# Altium footprint library Connectors.PcbLib: 117 footprints (part 3 of 8)
Each footprint in its own frame and in the unit in brackets; x right, y up, seen from the top. Pads: shape width x height; smd on the part's side, far side on the other; paste and mask are expansions set on the pad; w line width, h text height; cw(c..) or ccw(c..) is an arc to the next point about the centre after c.
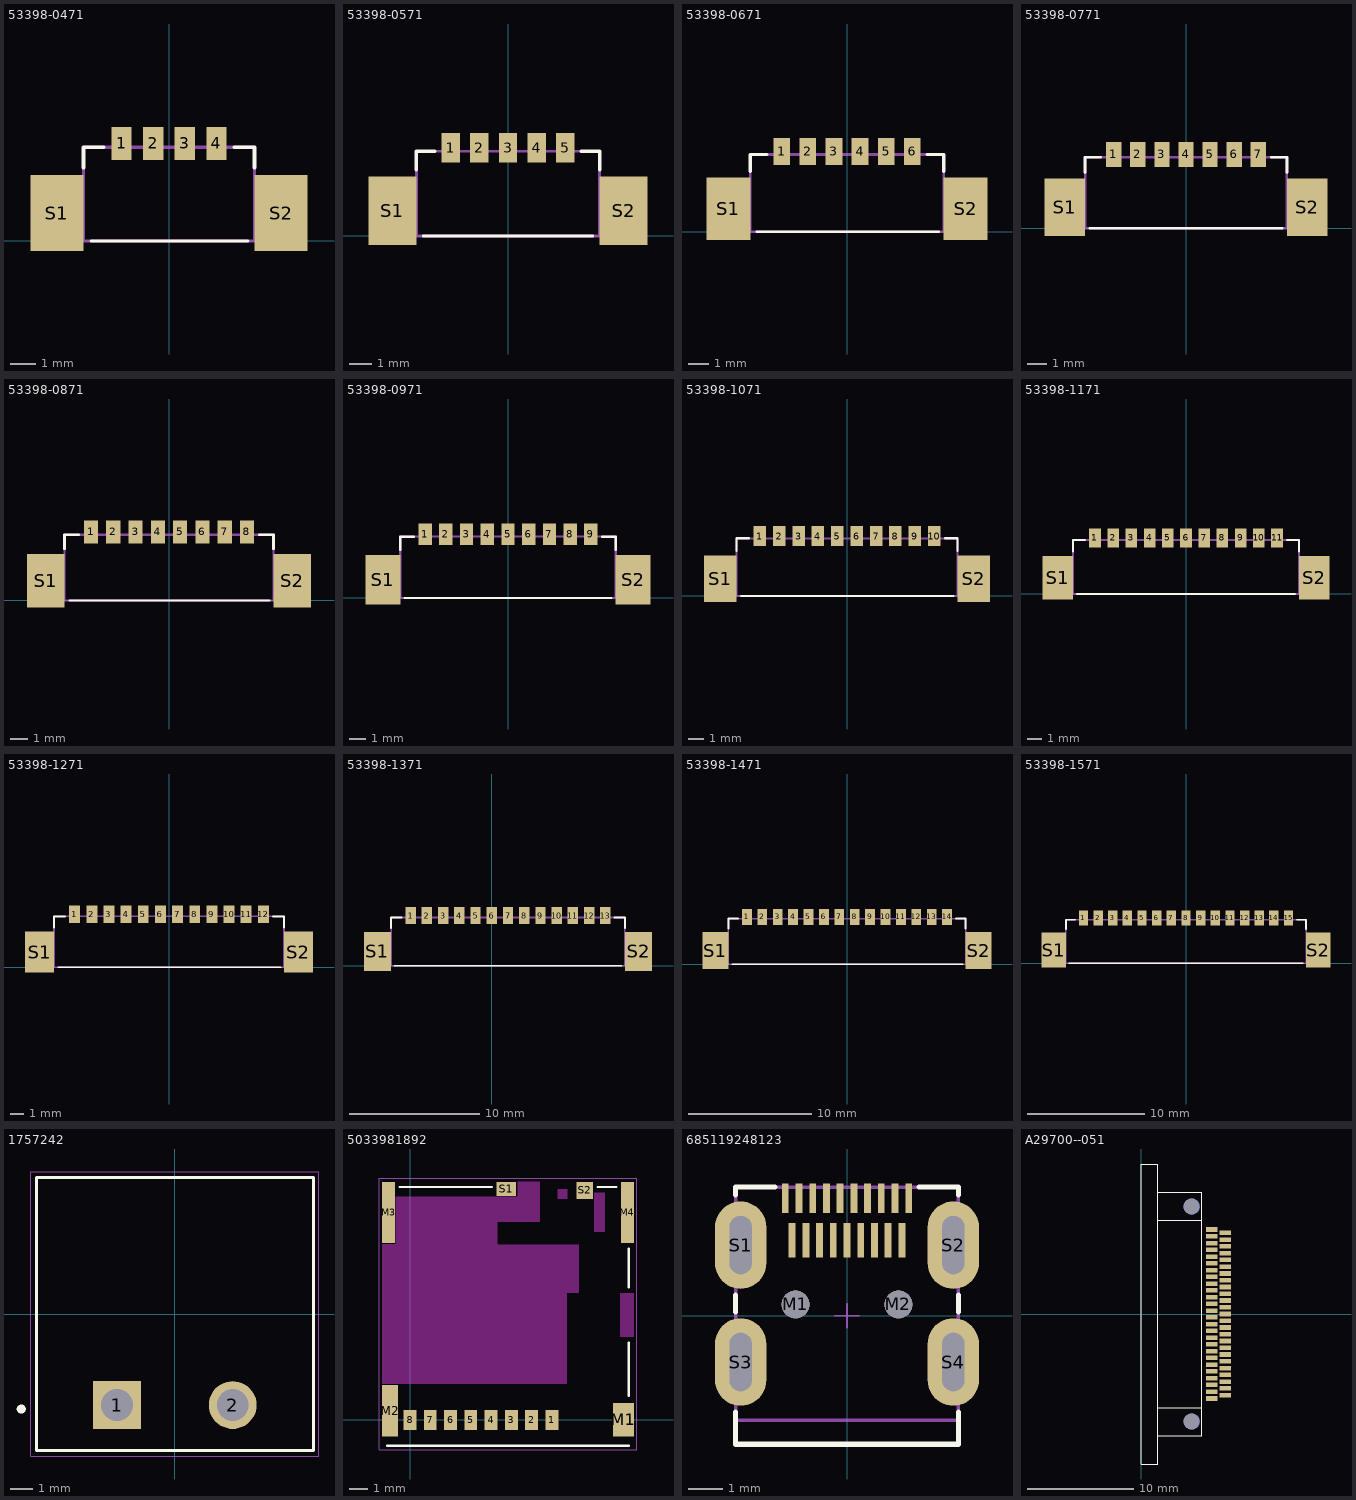
[diagram p2: the footprints below, top view; thin cyan lines are the x and y axes]

## 53398-0471 [mm] "Molex 1.25mm SMD"
pads (6):
  rect 0.8x1.3 smd: 1(-1.875,3.85) 2(-0.625,3.85) 3(0.625,3.85) 4(1.875,3.85)
  rect 2.1x3 smd: S1(-4.425,1.1) S2(4.425,1.1)
Top Overlay:
  lines w0.127: -3.075,0 3.125,0
  lines w0.152: -3.375,2.9 -3.375,3.7 -2.575,3.7 ; 2.575,3.7 3.375,3.7 3.375,2.9
Mechanical 13:
  lines w0.127: -4.375,0 4.375,0 ; -3.375,0 -3.375,3.7 3.375,3.7 3.375,0
3D body "533980471.stp": height 4.71, standoff 0.01, extent -5.075,0.025 5.075,4.225

## 53398-0571 [mm] "Molex 1.25mm SMD"
pads (7):
  rect 0.8x1.3 smd: 1(-2.5,3.85) 2(-1.25,3.85) 3(0,3.85) 4(1.25,3.85) 5(2.5,3.85)
  rect 2.1x3 smd: S1(-5.05,1.1) S2(5.05,1.1)
Top Overlay:
  lines w0.127: -3.7,0 3.7,0
  lines w0.152: -4,2.9 -4,3.7 -3.2,3.7 ; 3.2,3.7 4,3.7 4,2.9
Mechanical 13:
  lines w0.127: -5.5,0 5.5,0 ; -4,0 -4,3.7 4,3.7 4,0
3D body "533980571.stp": height 4.72, standoff 0.02, extent -5.7,0 5.7,4.2

## 53398-0671 [mm] "Molex 1.25mm SMD"
pads (8):
  rect 0.8x1.3 smd: 1(-3.125,3.85) 2(-1.875,3.85) 3(-0.625,3.85) 4(0.625,3.85) 5(1.875,3.85) 6(3.125,3.85)
  rect 2.1x3 smd: S1(-5.675,1.1) S2(5.675,1.1)
Top Overlay:
  lines w0.127: -4.325,0 4.375,0
  lines w0.152: -4.625,2.9 -4.625,3.7 -3.825,3.7 ; 3.825,3.7 4.625,3.7 4.625,2.9
Mechanical 13:
  lines w0.127: -5.625,0 5.625,0 ; -4.625,0 -4.625,3.7 4.625,3.7 4.625,0
3D body "533980671.stp": height 4.71, standoff 0.01, extent -6.325,0.025 6.325,4.225

## 53398-0771 [mm] "Molex 1.25mm SMD"
pads (9):
  rect 0.8x1.3 smd: 1(-3.75,3.85) 2(-2.5,3.85) 3(-1.25,3.85) 4(0,3.85) 5(1.25,3.85) 6(2.5,3.85) 7(3.75,3.85)
  rect 2.1x3 smd: S1(-6.3,1.1) S2(6.3,1.1)
Top Overlay:
  lines w0.127: -5,0 5,0
  lines w0.152: -5.25,2.9 -5.25,3.7 -4.45,3.7 ; 4.45,3.7 5.25,3.7 5.25,2.9
Mechanical 13:
  lines w0.127: -6.25,0 6.25,0 ; -5.25,0 -5.25,3.7 5.25,3.7 5.25,0
3D body "533980771.stp": height 4.71, standoff 0.01, extent -6.95,0.025 6.95,4.225

## 53398-0871 [mm] "Molex 1.25mm SMD"
pads (10):
  rect 0.8x1.3 smd: 1(-4.375,3.85) 2(-3.125,3.85) 3(-1.875,3.85) 4(-0.625,3.85) 5(0.625,3.85) 6(1.875,3.85) 7(3.125,3.85) 8(4.375,3.85)
  rect 2.1x3 smd: S1(-6.925,1.1) S2(6.925,1.1)
Top Overlay:
  lines w0.127: -5.575,0 5.625,0
  lines w0.152: -5.875,2.9 -5.875,3.7 -5.075,3.7 ; 5.075,3.7 5.875,3.7 5.875,2.9
Mechanical 13:
  lines w0.127: -6.875,0 6.875,0 ; -5.875,0 -5.875,3.7 5.875,3.7 5.875,0
3D body "533980871.stp": height 4.71, standoff 0.01, extent -7.575,0.025 7.575,4.225

## 53398-0971 [mm] "Molex 1.25mm SMD"
pads (11):
  rect 0.8x1.3 smd: 1(-5,3.85) 2(-3.75,3.85) 3(-2.5,3.85) 4(-1.25,3.85) 5(0,3.85) 6(1.25,3.85) 7(2.5,3.85) 8(3.75,3.85) 9(5,3.85)
  rect 2.1x3 smd: S1(-7.55,1.1) S2(7.55,1.1)
Top Overlay:
  lines w0.127: -6.25,0 6.25,0
  lines w0.152: -6.5,2.9 -6.5,3.7 -5.7,3.7 ; 5.7,3.7 6.5,3.7 6.5,2.9
Mechanical 13:
  lines w0.127: -7.5,0 7.5,0 ; -6.5,0 -6.5,3.7 6.5,3.7 6.5,0
3D body "533980971.stp": height 4.71, standoff 0.01, extent -8.2,0.025 8.2,4.225

## 53398-1071 [mm] "Molex 1.25mm SMD"
pads (12):
  rect 0.8x1.3 smd: 1(-5.625,3.85) 2(-4.375,3.85) 3(-3.125,3.85) 4(-1.875,3.85) 5(-0.625,3.85) 6(0.625,3.85) 7(1.875,3.85) 8(3.125,3.85) 9(4.375,3.85) 10(5.625,3.85)
  rect 2.1x3 smd: S1(-8.175,1.1) S2(8.175,1.1)
Top Overlay:
  lines w0.127: -6.825,0 6.875,0
  lines w0.152: -7.125,2.9 -7.125,3.7 -6.325,3.7 ; 6.325,3.7 7.125,3.7 7.125,2.9
Mechanical 13:
  lines w0.127: -8.125,0 8.125,0 ; -7.125,0 -7.125,3.7 7.125,3.7 7.125,0
3D body "533981071.stp": height 4.71, standoff 0.01, extent -8.825,0.025 8.825,4.225

## 53398-1171 [mm] "Molex 1.25mm SMD"
pads (13):
  rect 0.8x1.3 smd: 1(-6.25,3.85) 2(-5,3.85) 3(-3.75,3.85) 4(-2.5,3.85) 5(-1.25,3.85) 6(0,3.85) 7(1.25,3.85) 8(2.5,3.85) 9(3.75,3.85) 10(5,3.85) 11(6.25,3.85)
  rect 2.1x3 smd: S1(-8.8,1.1) S2(8.8,1.1)
Top Overlay:
  lines w0.127: -7.5,0 7.5,0
  lines w0.152: -7.75,2.9 -7.75,3.7 -6.95,3.7 ; 6.95,3.7 7.75,3.7 7.75,2.9
Mechanical 13:
  lines w0.127: -8.75,0 8.75,0 ; -7.75,0 -7.75,3.7 7.75,3.7 7.75,0
3D body "533981171.stp": height 4.71, standoff 0.01, extent -9.45,0.025 9.45,4.225

## 53398-1271 [mm] "Molex 1.25mm SMD"
pads (14):
  rect 0.8x1.3 smd: 1(-6.875,3.85) 2(-5.625,3.85) 3(-4.375,3.85) 4(-3.125,3.85) 5(-1.875,3.85) 6(-0.625,3.85) 7(0.625,3.85) 8(1.875,3.85) 9(3.125,3.85) 10(4.375,3.85) 11(5.625,3.85) 12(6.875,3.85)
  rect 2.1x3 smd: S1(-9.425,1.1) S2(9.425,1.1)
Top Overlay:
  lines w0.127: -8.075,0 8.125,0
  lines w0.152: -8.375,2.9 -8.375,3.7 -7.575,3.7 ; 7.575,3.7 8.375,3.7 8.375,2.9
Mechanical 13:
  lines w0.127: -9.375,0 9.375,0 ; -8.375,0 -8.375,3.7 8.375,3.7 8.375,0
3D body "533981271.stp": height 4.71, standoff 0.01, extent -10.075,0.025 10.075,4.225

## 53398-1371 [mm] "Molex 1.25mm SMD"
pads (15):
  rect 0.8x1.3 smd: 1(-6.25,3.85) 2(-5,3.85) 3(-3.75,3.85) 4(-2.5,3.85) 5(-1.25,3.85) 6(0,3.85) 7(1.25,3.85) 8(2.5,3.85) 9(3.75,3.85) 10(5,3.85) 11(6.25,3.85) 12(7.5,3.85) 13(8.75,3.85)
  rect 2.1x3 smd: S1(-8.8,1.1) S2(11.3,1.1)
Top Overlay:
  lines w0.127: -7.5,0 10,0
  lines w0.152: -7.75,2.9 -7.75,3.7 -6.95,3.7 ; 9.45,3.7 10.25,3.7 10.25,2.9
Mechanical 13:
  lines w0.127: -8.75,0 11.25,0 ; -7.75,0 -7.75,3.7 10.25,3.7 10.25,0
3D body "533981371.stp": height 4.71, standoff 0.01, extent -9.45,0 11.95,4.2

## 53398-1471 [mm] "Molex 1.25mm SMD"
pads (16):
  rect 0.8x1.3 smd: 1(-8.125,3.85) 2(-6.875,3.85) 3(-5.625,3.85) 4(-4.375,3.85) 5(-3.125,3.85) 6(-1.875,3.85) 7(-0.625,3.85) 8(0.625,3.85) 9(1.875,3.85) 10(3.125,3.85) 11(4.375,3.85) 12(5.625,3.85) 13(6.875,3.85) 14(8.125,3.85)
  rect 2.1x3 smd: S1(-10.675,1.1) S2(10.675,1.1)
Top Overlay:
  lines w0.127: -9.325,0 9.375,0
  lines w0.152: -9.625,2.9 -9.625,3.7 -8.825,3.7 ; 8.825,3.7 9.625,3.7 9.625,2.9
Mechanical 13:
  lines w0.127: -10.625,0 10.625,0 ; -9.625,0 -9.625,3.7 9.625,3.7 9.625,0
3D body "533981471.stp": height 4.71, standoff 0.01, extent -11.325,0.025 11.325,4.225

## 53398-1571 [mm] "Molex 1.25mm SMD"
pads (17):
  rect 0.8x1.3 smd: 1(-8.75,3.85) 2(-7.5,3.85) 3(-6.25,3.85) 4(-5,3.85) 5(-3.75,3.85) 6(-2.5,3.85) 7(-1.25,3.85) 8(0,3.85) 9(1.25,3.85) 10(2.5,3.85) 11(3.75,3.85) 12(5,3.85) 13(6.25,3.85) 14(7.5,3.85) 15(8.75,3.85)
  rect 2.1x3 smd: S1(-11.3,1.1) S2(11.3,1.1)
Top Overlay:
  lines w0.127: -10,0 10,0
  lines w0.152: -10.25,2.9 -10.25,3.7 -9.45,3.7 ; 9.45,3.7 10.25,3.7 10.25,2.9
Mechanical 13:
  lines w0.127: -11.25,0 11.25,0 ; -10.25,0 -10.25,3.7 10.25,3.7 10.25,0
3D body "533981571.stp": height 4.71, standoff 0.01, extent -11.95,0.025 11.95,4.225

## 1757242 [mm] "2 Position Terminal Block Header, Male Pins, Shrouded (4 Side) 0.200\" (5.08mm) 90°, Right Angle  Through Hole"
pads (2):
  rect 2.1x2.1 hole 1.4: 1(-2.54,-4)
  round 2.1 hole 1.4: 2(2.54,-4)
Top Overlay:
  circle w0.2: c-6.745,-4.175 r0.1
  lines w0.127: -6.08,-6 6.08,-6 6.08,6 -6.08,6 -6.08,-6
Mechanical 4:
  lines w0.127: -6.08,-6 6.08,-6 ; -6.08,-6 -6.08,6 ; -6.08,-6 6.08,-6 ; -6.08,-6 -6.08,6 ; -6.08,6 6.08,6 ; -6.08,6 6.08,6 ; 6.08,-6 6.08,6 ; 6.08,-6 6.08,6
Mechanical 16:
  lines w0.05: -6.33,-6.25 6.33,-6.25 6.33,6.25 -6.33,6.25 -6.33,-6.25
3D body "pxc_1757242_06_MSTBA-2-5-2-G-5-08_3D.stp": height 8.6, standoff -3.5, extent -6.08,-5.906 6.08,6.096

## 5033981892 [mm] "Molex MicroSD Card Socket"
pads (14):
  rect 0.7x1.1 smd: 1(7.7,0) 2(6.6,0) 3(5.5,0) 4(4.4,0) 5(3.3,0) 6(2.2,0) 7(1.1,0) 8(0,0)
  rect 1.14x1.83 smd: M1(11.58,0.015)
  rect 0.86x2.8 smd: M2(-1.08,0.5)
  rect 0.7x3.33 smd: M3(-1.16,11.265) M4(11.8,11.265)
  rect 1.05x0.78 smd: S1(5.225,12.54)
  rect 0.9x0.93 smd: S2(9.49,12.465)
Top Layer keep-out:
  rectangle: -0.4,4.925 8.1,6.925
  rectangle: 8,12 8.55,12.55
  rectangle: 10,10.2 10.575,12.35
  rectangle: 11.4,4.5 12.175,6.9
  region: 8.5,1.95 8.5,6.9 9.15,6.9 9.15,9.5 4.725,9.5 4.725,10.75 7.05,10.75 7.05,12.925 5.85,12.925 5.85,12.125 -0.775,12.125 -0.775,9.55 -1.5,9.55 -1.5,1.95
Top Overlay:
  lines w0.127: -1.23,-1.4 11.87,-1.4 ; -0.556,12.65 4.446,12.65 ; 10.194,12.65 11.196,12.65 ; 11.87,1.3 11.87,4.2 ; 11.87,7.2 11.87,9.3
Mechanical 4:
  circle w0.2: c7.7,-0.15 r0.1
  circle w0.2: c7.7,-0.15 r0.1
Mechanical 16:
  lines w0.05: -1.68,-1.625 -1.68,13.125 12.32,13.125 12.32,-1.625 -1.68,-1.625
3D body "5033981892.stp": height 1.28, standoff 0, extent -1.325,-1.325 11.775,12.725

## 685119248123 [mm] "Micro HDMI Horizontal SMT"
height 3
pads (25):
  rect 0.2x0.85 smd: 1(1.8,3.425) 3(1.4,3.425) 5(1,3.425) 7(0.6,3.425) 9(0.2,3.425) 11(-0.2,3.425) 13(-0.6,3.425) 15(-1,3.425) 17(-1.4,3.425) 19(-1.8,3.425)
  rect 0.2x1 smd: 2(1.6,2.2) 4(1.2,2.2) 6(0.8,2.2) 8(0.4,2.2) 10(0,2.2) 12(-0.4,2.2) 14(-0.8,2.2) 16(-1.2,2.2) 18(-1.6,2.2)
  round 0.81 hole 0.81 unplated: M1(-1.5,0.33) M2(1.5,0.33)
  oval 1.5x2.55 hole 0.65 slot 1.7 at 90 deg: S1(-3.1,2.06) S2(3.1,2.06) S3(-3.1,-1.35) S4(3.1,-1.35)
Top Overlay:
  lines w0.15: -3.25,-2.81 -3.25,-3.75 3.25,-3.75 3.25,-2.81 ; -3.25,0.11 -3.25,0.6 ; -3.25,3.52 -3.25,3.75 -2.1,3.75 ; 2.1,3.75 3.25,3.75 3.25,3.52 ; 3.25,0.11 3.25,0.6
Mechanical 1:
  lines w0.1: -3.25,-3.05 3.25,-3.05
  text "PCB Edge" at -1.794,-2.746 h0.89
Mechanical 13:
  lines w0.1: -3.25,-3.75 -3.25,3.75 3.25,3.75 3.25,-3.75 -3.25,-3.75
Mechanical 15:
  lines w0.05: -0.35,0 0.35,0 ; 0,-0.35 0,0.35
3D body "Micro_HDMI_Connector.STEP": height 4.9, standoff -2.1, extent -5.2,-87.27 5.2,0.3
3D body "685119248123.stp": height 2.99, standoff -1.11, extent -3.25,-3.75 3.25,3.755

## A29700--051 [mm] "Omnetics Bi-Lobe MIL-DTL-32139"
pads (53):
  rect 1.06x0.432 smd: 1(6.63,7.938) 2(6.63,7.303) 3(6.63,6.668) 4(6.63,6.033) 5(6.63,5.398) 6(6.63,4.763) 7(6.63,4.128) 8(6.63,3.493) 9(6.63,2.857) 10(6.63,2.222) 11(6.63,1.587) 12(6.63,0.952) 13(6.63,0.317) 14(6.63,-0.318) 15(6.63,-0.953) 16(6.63,-1.588) 17(6.63,-2.223) 18(6.63,-2.858) 19(6.63,-3.493) 20(6.63,-4.128) 21(6.63,-4.763) 22(6.63,-5.398) 23(6.63,-6.033) 24(6.63,-6.668) 25(6.63,-7.303) 26(6.63,-7.938) 27(7.9,7.62) 28(7.9,6.985) 29(7.9,6.35) 30(7.9,5.715) 31(7.9,5.08) 32(7.9,4.445) 33(7.9,3.81) 34(7.9,3.175) 35(7.9,2.54) 36(7.9,1.905) 37(7.9,1.27) 38(7.9,0.635) 39(7.9,0) 40(7.9,-0.635) 41(7.9,-1.27) 42(7.9,-1.905) 43(7.9,-2.54) 44(7.9,-3.175) 45(7.9,-3.81) 46(7.9,-4.445) 47(7.9,-5.08) 48(7.9,-5.715) 49(7.9,-6.35) 50(7.9,-6.985) 51(7.9,-7.62)
  round 1.5 on Bottom hole 1.5 unplated: ""(4.75,-10.097) ""(4.75,10.097)
Top Overlay:
  lines w0.05: 1.575,-11.43 5.715,-11.43 5.715,11.43 1.575,11.43 ; 0,-14.097 0,14.097 1.575,14.097 1.575,-14.097 0,-14.097
  lines w0.051: 1.587,-8.827 5.715,-8.827 ; 1.587,8.827 5.715,8.827
Bottom Overlay:
  circle w0.05: c4.75,10.097 r1.27
  circle w0.05: c4.75,-10.097 r1.27
  circle w1.35: c4.75,10.097 r1.425
  circle w1.35: c4.75,-10.097 r1.425
3D body "A29700-051.stp": height 4.02, standoff -0.24, extent 0,-14.097 8.23,14.097